# Altium footprint library Gesturelink PCB Library.PcbLib: 57 footprints (part 4 of 4)
Each footprint in its own frame and in the unit in brackets; x right, y up, seen from the top. Pads: shape width x height; smd on the part's side, far side on the other; paste and mask are expansions set on the pad; w line width, h text height; cw(c..) or ccw(c..) is an arc to the next point about the centre after c.
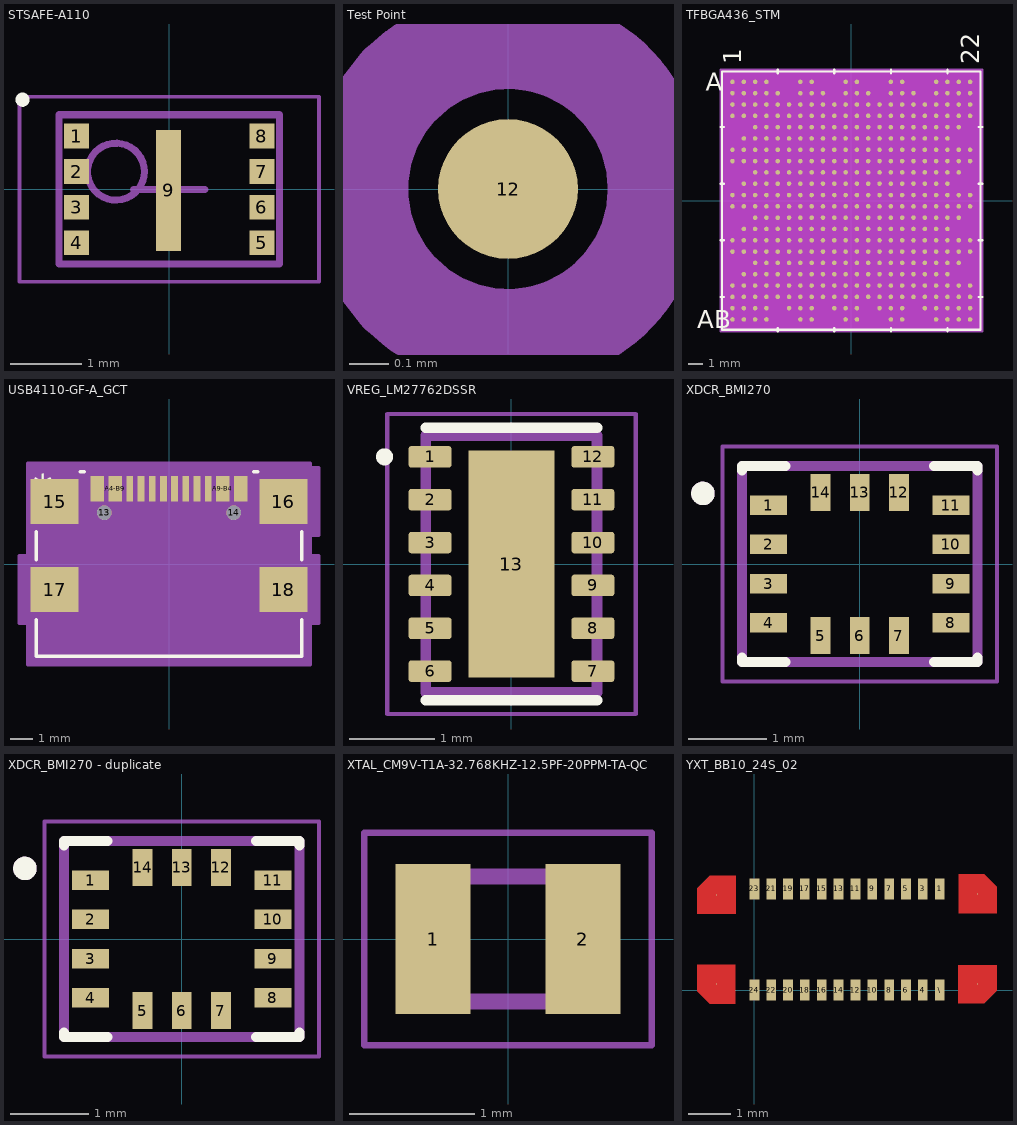
[diagram p3: the footprints below, top view; thin cyan lines are the x and y axes]

## STSAFE-A110 [mm] "SON, 8-Leads, Body 2.00x3.00mm, Pitch 0.50mm, Thermal Pad 0.00x0.00mm, IPC Medium Density"
height 0.6
pads (9):
  rect 0.35x0.35 smd: 1(-1.303,0.75) 2(-1.303,0.25) 3(-1.303,-0.25) 4(-1.303,-0.75) 5(1.303,-0.75) 6(1.303,-0.25) 7(1.303,0.25) 8(1.303,0.75)
  rect 0.35x1.7 smd: 9(-0.008,-0.012)
Top Overlay:
  circle w0.1: c-2.062,1.262 r0.05
Mechanical 13:
  circle w0.1: c-0.75,0.25 r0.4
  lines w0.1: -1.55,-1.05 -1.55,1.05 1.55,1.05 1.55,-1.05 -1.55,-1.05
Mechanical 15:
  lines w0.05: -2.105,-1.3 -2.105,1.3 2.105,1.3 2.105,-1.3 -2.105,-1.3
  lines w0.1: -0.5,0 0.5,0 ; 0,-0.5 0,0.5
3D body: height 0.6, standoff 0.02, extent -1.55,-1.05 1.55,1.05

## Test Point [mil]
pads (1):
  round 14 smd: 12(0,0)
Mechanical 15:
  circle w10: c0,0 r15

## TFBGA436_STM [mm]
pads (436):
  round 0.32 smd paste+0 mask+0: A1(-8.4,8.4) A2(-7.6,8.4) A3(-6.8,8.4) A4(-6,8.4) A7(-3.6,8.4) A8(-2.8,8.4) A11(-0.4,8.4) A12(0.4,8.4) A15(2.8,8.4) A16(3.6,8.4) A19(6,8.4) A20(6.8,8.4) A21(7.6,8.4) A22(8.4,8.4) AA1(-8.4,-7.6) AA2(-7.6,-7.6) AA3(-6.8,-7.6) AA4(-6,-7.6) AA6(-4.4,-7.6) AA7(-3.6,-7.6) AA8(-2.8,-7.6) AA10(-1.2,-7.6) AA11(-0.4,-7.6) AA12(0.4,-7.6) AA14(2,-7.6) AA15(2.8,-7.6) AA16(3.6,-7.6) AA18(5.2,-7.6) AA19(6,-7.6) AA20(6.8,-7.6) AA21(7.6,-7.6) AA22(8.4,-7.6) AB1(-8.4,-8.4) AB2(-7.6,-8.4) AB3(-6.8,-8.4) AB4(-6,-8.4) AB7(-3.6,-8.4) AB8(-2.8,-8.4) AB11(-0.4,-8.4) AB12(0.4,-8.4) AB15(2.8,-8.4) AB16(3.6,-8.4) AB19(6,-8.4) AB20(6.8,-8.4) AB21(7.6,-8.4) AB22(8.4,-8.4) B1(-8.4,7.6) B2(-7.6,7.6) B3(-6.8,7.6) B4(-6,7.6) B5(-5.2,7.6) B7(-3.6,7.6) B8(-2.8,7.6) B9(-2,7.6) B11(-0.4,7.6) B12(0.4,7.6) B13(1.2,7.6) B15(2.8,7.6) B16(3.6,7.6) B17(4.4,7.6) B19(6,7.6) B20(6.8,7.6) B21(7.6,7.6) B22(8.4,7.6) C1(-8.4,6.8) C2(-7.6,6.8) C3(-6.8,6.8) C4(-6,6.8) C5(-5.2,6.8) C6(-4.4,6.8) C7(-3.6,6.8) C8(-2.8,6.8) C9(-2,6.8) C10(-1.2,6.8) C11(-0.4,6.8) C12(0.4,6.8) C13(1.2,6.8) C14(2,6.8) C15(2.8,6.8) C16(3.6,6.8) C17(4.4,6.8) C18(5.2,6.8) C19(6,6.8) C20(6.8,6.8) C21(7.6,6.8) C22(8.4,6.8) D1(-8.4,6) D2(-7.6,6) D3(-6.8,6) D4(-6,6) D5(-5.2,6) D6(-4.4,6) D7(-3.6,6) D8(-2.8,6) D9(-2,6) D10(-1.2,6) D11(-0.4,6) D12(0.4,6) D13(1.2,6) D14(2,6) D15(2.8,6) D16(3.6,6) D17(4.4,6) D18(5.2,6) D19(6,6) D20(6.8,6) D21(7.6,6) D22(8.4,6) E3(-6.8,5.2) E4(-6,5.2) E5(-5.2,5.2) E6(-4.4,5.2) E7(-3.6,5.2) E8(-2.8,5.2) E9(-2,5.2) E10(-1.2,5.2) E11(-0.4,5.2) E12(0.4,5.2) E13(1.2,5.2) E14(2,5.2) E15(2.8,5.2) E16(3.6,5.2) E17(4.4,5.2) E18(5.2,5.2) E19(6,5.2) E20(6.8,5.2) E21(7.6,5.2) F2(-7.6,4.4) F3(-6.8,4.4) F4(-6,4.4) F5(-5.2,4.4) F6(-4.4,4.4) F7(-3.6,4.4) F8(-2.8,4.4) F9(-2,4.4) F10(-1.2,4.4) F11(-0.4,4.4) F12(0.4,4.4) F13(1.2,4.4) F14(2,4.4) F15(2.8,4.4) F16(3.6,4.4) F17(4.4,4.4) F18(5.2,4.4) F19(6,4.4) F20(6.8,4.4) G1(-8.4,3.6) G2(-7.6,3.6) G3(-6.8,3.6) G4(-6,3.6) G5(-5.2,3.6) G6(-4.4,3.6) G7(-3.6,3.6) G8(-2.8,3.6) G9(-2,3.6) G10(-1.2,3.6) G11(-0.4,3.6) G12(0.4,3.6) G13(1.2,3.6) G14(2,3.6) G15(2.8,3.6) G16(3.6,3.6) G17(4.4,3.6) G18(5.2,3.6) G19(6,3.6) G20(6.8,3.6) G21(7.6,3.6) G22(8.4,3.6) H1(-8.4,2.8) H2(-7.6,2.8) H3(-6.8,2.8) H4(-6,2.8) H5(-5.2,2.8) H6(-4.4,2.8) H7(-3.6,2.8) H8(-2.8,2.8) H9(-2,2.8) H10(-1.2,2.8) H11(-0.4,2.8) H12(0.4,2.8) H13(1.2,2.8) H14(2,2.8) H15(2.8,2.8) H16(3.6,2.8) H17(4.4,2.8) H18(5.2,2.8) H19(6,2.8) H20(6.8,2.8) H21(7.6,2.8) H22(8.4,2.8) J3(-6.8,2) J4(-6,2) J5(-5.2,2) J6(-4.4,2) J7(-3.6,2) J8(-2.8,2) J9(-2,2) J10(-1.2,2) J11(-0.4,2) J12(0.4,2) J13(1.2,2) J14(2,2) J15(2.8,2) J16(3.6,2) J17(4.4,2) J18(5.2,2) J19(6,2) J20(6.8,2) J21(7.6,2) K2(-7.6,1.2) K3(-6.8,1.2) K4(-6,1.2) K5(-5.2,1.2) K6(-4.4,1.2) K7(-3.6,1.2) K8(-2.8,1.2) K9(-2,1.2) K10(-1.2,1.2) K11(-0.4,1.2) K12(0.4,1.2) K13(1.2,1.2) K14(2,1.2) K15(2.8,1.2) K16(3.6,1.2) K17(4.4,1.2) K18(5.2,1.2) K19(6,1.2) K20(6.8,1.2) L1(-8.4,0.4) L2(-7.6,0.4) L3(-6.8,0.4) L4(-6,0.4) L5(-5.2,0.4) L6(-4.4,0.4) L7(-3.6,0.4) L8(-2.8,0.4) L9(-2,0.4) L10(-1.2,0.4) L11(-0.4,0.4) L12(0.4,0.4) L13(1.2,0.4) L14(2,0.4) L15(2.8,0.4) L16(3.6,0.4) L17(4.4,0.4) L18(5.2,0.4) L19(6,0.4) L20(6.8,0.4) L21(7.6,0.4) L22(8.4,0.4) M1(-8.4,-0.4) M2(-7.6,-0.4) M3(-6.8,-0.4) M4(-6,-0.4) M5(-5.2,-0.4) M6(-4.4,-0.4) M7(-3.6,-0.4) M8(-2.8,-0.4) M9(-2,-0.4) M10(-1.2,-0.4) M11(-0.4,-0.4) M12(0.4,-0.4) M13(1.2,-0.4) M14(2,-0.4) M15(2.8,-0.4) M16(3.6,-0.4) M17(4.4,-0.4) M18(5.2,-0.4) M19(6,-0.4) M20(6.8,-0.4) M21(7.6,-0.4) M22(8.4,-0.4) N3(-6.8,-1.2) N4(-6,-1.2) N5(-5.2,-1.2) N6(-4.4,-1.2) N7(-3.6,-1.2) N8(-2.8,-1.2) N9(-2,-1.2) N10(-1.2,-1.2) N11(-0.4,-1.2) N12(0.4,-1.2) N13(1.2,-1.2) N14(2,-1.2) N15(2.8,-1.2) N16(3.6,-1.2) N17(4.4,-1.2) N18(5.2,-1.2) N19(6,-1.2) N20(6.8,-1.2) N21(7.6,-1.2) P2(-7.6,-2) P3(-6.8,-2) P4(-6,-2) P5(-5.2,-2) P6(-4.4,-2) P7(-3.6,-2) P8(-2.8,-2) P9(-2,-2) P10(-1.2,-2) P11(-0.4,-2) P12(0.4,-2) P13(1.2,-2) P14(2,-2) P15(2.8,-2) P16(3.6,-2) P17(4.4,-2) P18(5.2,-2) P19(6,-2) P20(6.8,-2) R1(-8.4,-2.8) R2(-7.6,-2.8) R3(-6.8,-2.8) R4(-6,-2.8) R5(-5.2,-2.8) R6(-4.4,-2.8) R7(-3.6,-2.8) R8(-2.8,-2.8) R9(-2,-2.8) R10(-1.2,-2.8) R11(-0.4,-2.8) R12(0.4,-2.8) R13(1.2,-2.8) R14(2,-2.8) R15(2.8,-2.8) R16(3.6,-2.8) R17(4.4,-2.8) R18(5.2,-2.8) R19(6,-2.8) R20(6.8,-2.8) R21(7.6,-2.8) R22(8.4,-2.8) T1(-8.4,-3.6) T2(-7.6,-3.6) T3(-6.8,-3.6) T4(-6,-3.6) T5(-5.2,-3.6) T6(-4.4,-3.6) T7(-3.6,-3.6) T8(-2.8,-3.6) T9(-2,-3.6) T10(-1.2,-3.6) T11(-0.4,-3.6) T12(0.4,-3.6) T13(1.2,-3.6) T14(2,-3.6) T15(2.8,-3.6) T16(3.6,-3.6) T17(4.4,-3.6) T18(5.2,-3.6) T19(6,-3.6) T20(6.8,-3.6) T21(7.6,-3.6) T22(8.4,-3.6) U3(-6.8,-4.4) U4(-6,-4.4) U5(-5.2,-4.4) U6(-4.4,-4.4) U7(-3.6,-4.4) U8(-2.8,-4.4) U9(-2,-4.4) U10(-1.2,-4.4) U11(-0.4,-4.4) U12(0.4,-4.4) U13(1.2,-4.4) U14(2,-4.4) U15(2.8,-4.4) U16(3.6,-4.4) U17(4.4,-4.4) U18(5.2,-4.4) U19(6,-4.4) U20(6.8,-4.4) U21(7.6,-4.4) V2(-7.6,-5.2) V3(-6.8,-5.2) V4(-6,-5.2) V5(-5.2,-5.2) V6(-4.4,-5.2) V7(-3.6,-5.2) V8(-2.8,-5.2) V9(-2,-5.2) V10(-1.2,-5.2) V11(-0.4,-5.2) V12(0.4,-5.2) V13(1.2,-5.2) V14(2,-5.2) V15(2.8,-5.2) V16(3.6,-5.2) V17(4.4,-5.2) V18(5.2,-5.2) V19(6,-5.2) V20(6.8,-5.2) W1(-8.4,-6) W2(-7.6,-6) W3(-6.8,-6) W4(-6,-6) W5(-5.2,-6) W6(-4.4,-6) W7(-3.6,-6) W8(-2.8,-6) W9(-2,-6) W10(-1.2,-6) W11(-0.4,-6) W12(0.4,-6) W13(1.2,-6) W14(2,-6) W15(2.8,-6) W16(3.6,-6) W17(4.4,-6) W18(5.2,-6) W19(6,-6) W20(6.8,-6) W21(7.6,-6) W22(8.4,-6) Y1(-8.4,-6.8) Y2(-7.6,-6.8) Y3(-6.8,-6.8) Y4(-6,-6.8) Y5(-5.2,-6.8) Y6(-4.4,-6.8) Y7(-3.6,-6.8) Y8(-2.8,-6.8) Y9(-2,-6.8) Y10(-1.2,-6.8) Y11(-0.4,-6.8) Y12(0.4,-6.8) Y13(1.2,-6.8) Y14(2,-6.8) Y15(2.8,-6.8) Y16(3.6,-6.8) Y17(4.4,-6.8) Y18(5.2,-6.8) Y19(6,-6.8) Y20(6.8,-6.8) Y21(7.6,-6.8) Y22(8.4,-6.8)
Top Overlay:
  lines w0.152: -9.258,-6.8 -9.004,-6.8 ; -9.258,-2.8 -9.004,-2.8 ; -9.258,1.2 -9.004,1.2 ; -9.258,5.2 -9.004,5.2 ; -5.2,-9.258 -5.2,-9.004 ; -5.2,9.004 -5.2,9.258 ; -1.2,-9.258 -1.2,-9.004 ; -1.2,9.004 -1.2,9.258 ; 2.8,-9.258 2.8,-9.004 ; 2.8,9.004 2.8,9.258 ; 6.8,-9.258 6.8,-9.004 ; 6.8,9.004 6.8,9.258 ; 9.004,-6.8 9.258,-6.8 ; 9.004,-2.8 9.258,-2.8 ; 9.004,1.2 9.258,1.2 ; 9.004,5.2 9.258,5.2 ; -9.131,-9.131 9.131,-9.131 9.131,9.131 -9.131,9.131 -9.131,-9.131
  text "A" at -10.274,7.765 h1.27
  text "AB" at -10.909,-9.035 h1.27
  text "1" at -7.765,9.639 h1.27
  text "22" at 9.035,9.639 h1.27
Bottom Overlay:
  text "A" at -9.639,7.765 h1.27
  text "AB" at -9.639,-9.035 h1.27
  text "1" at -9.035,9.639 h1.27
  text "22" at 7.765,9.639 h1.27
Keep-Out Layer:
  region: -9.245,-9.245 -9.245,9.245 9.245,9.245 9.245,-9.245
Mechanical 13:
  lines w0.025: -9.004,8.604 -8.604,9.004 ; -9.004,-9.004 9.004,-9.004 9.004,9.004 -9.004,9.004 -9.004,-9.004
  text "A" at -10.274,7.765 h1.27
  text "AB" at -10.909,-9.035 h1.27
  text "1" at -7.765,9.639 h1.27
  text "22" at 9.035,9.639 h1.27
Mechanical 15:
  region: 9.258,-9.258 -9.258,-9.258 -9.258,9.258 9.258,9.258
  lines w0.152: -9.258,-9.258 -9.258,9.258 9.258,9.258 9.258,-9.258 -9.258,-9.258
3D body "TFBGA436_STM.step": height 1.2, standoff 0, extent -9.004,-9.004 9.004,9.004

## USB4110-GF-A_GCT [mil]
pads (18):
  round 26 / inner round 60 / far side round 26 hole 26 unplated paste-99999 mask-13: 13(-113.78,90.07) 14(113.78,90.07)
  rect 85x79 smd paste+0 mask+0: 15(-201.18,109.76) 16(201.18,109.76) 17(-201.18,-44.97) 18(201.18,-44.97)
  rect 24x45 smd paste+0 mask+0: A1-B12(-125.98,132.39) A4-B9(-94.49,132.39) A9-B4(94.49,132.39) A12-B1(125.98,132.39)
  rect 12x45 smd paste+0 mask+0: A5(-49.21,132.39) A6(-9.84,132.39) A7(9.84,132.39) A8(49.21,132.39) B5(68.9,132.39) B6(29.53,132.39) B7(-29.53,132.39) B8(-68.9,132.39)
Top Overlay:
  lines w6: -233.5,-97.57 -233.5,-162 233.5,-162 233.5,-97.57 ; -233.5,7.63 -233.5,57.16 ; -155.65,162 -148.99,162 ; 148.99,162 155.65,162 ; 233.5,7.63 233.5,57.16
  text "*" at -238.48,107.39 h50
Mechanical 13:
  lines w1: -228.5,-157 -228.5,157 228.5,157 228.5,-157 -228.5,-157
  text "*" at -238.48,107.39 h50
Mechanical 15:
  region: -263.68,-104.47 -248.5,-104.47 -248.5,-177 248.5,-177 248.5,-104.47 263.68,-104.47 263.68,14.53 248.5,14.53 248.5,50.26 263.68,50.26 263.68,169.26 248.5,169.26 248.5,177 -248.5,177 -248.5,14.53 -263.68,14.53
  lines w6: -263.68,-104.47 -263.68,14.53 -248.5,14.53 -248.5,177 248.5,177 248.5,169.26 263.68,169.26 263.68,50.26 248.5,50.26 248.5,14.53 263.68,14.53 263.68,-104.47 248.5,-104.47 248.5,-177 -248.5,-177 -248.5,-104.47 -263.68,-104.47
3D body "USB4110GFA--3DModel-STEP-269445.STEP": height 128.35, standoff -24.61, extent -222.32,-154.06 222.56,149.09

## VREG_LM27762DSSR [mm]
pads (13):
  rrect25% 0.5x0.25 smd: 1(-0.95,1.25) 2(-0.95,0.75) 3(-0.95,0.25) 4(-0.95,-0.25) 5(-0.95,-0.75) 6(-0.95,-1.25) 7(0.95,-1.25) 8(0.95,-0.75) 9(0.95,-0.25) 10(0.95,0.25) 11(0.95,0.75) 12(0.95,1.25)
  rect 1x2.65 smd paste-2: 13(0,0)
Top Overlay:
  circle w0.1: c-1.481,1.25 r0.05
  lines w0.127: -1,-1.59 1,-1.59 ; -1,1.59 1,1.59
Top Paste:
  region: 0.475,0.1 -0.475,0.1 -0.475,1.27 0.475,1.27
  region: 0.475,-1.271 -0.475,-1.271 -0.475,-0.1 0.475,-0.1
Mechanical 13:
  lines w0.127: -1,-1.5 -1,1.5 1,1.5 1,-1.5 -1,-1.5
Mechanical 15:
  lines w0.05: -1.45,-1.75 -1.45,1.75 1.45,1.75 1.45,-1.75 -1.45,-1.75
3D body "step_temp.STEP": height 0.8, standoff 0, extent -1,-1.5 1,1.5

## XDCR_BMI270 [mm]
height 0.87
pads (14):
  rect 0.475x0.25 smd: 1(-1.162,0.75) 2(-1.162,0.25) 3(-1.162,-0.25) 4(-1.162,-0.75) 8(1.162,-0.75) 9(1.162,-0.25) 10(1.162,0.25) 11(1.162,0.75)
  rect 0.25x0.475 smd: 5(-0.5,-0.913) 6(0,-0.913) 7(0.5,-0.913) 12(0.5,0.913) 13(0,0.913) 14(-0.5,0.913)
Top Overlay:
  circle w0.15: c-2,0.9 r0.075
  lines w0.127: -1.5,-1.195 -1.5,-1.25 -0.945,-1.25 ; -1.5,1.195 -1.5,1.25 -0.945,1.25 ; 0.945,-1.25 1.5,-1.25 1.5,-1.195 ; 0.945,1.25 1.5,1.25 1.5,1.195
Mechanical 13:
  circle w0.15: c-2,0.9 r0.075
  lines w0.127: -1.5,-1.25 -1.5,1.25 1.5,1.25 1.5,-1.25 -1.5,-1.25
Mechanical 15:
  lines w0.05: -1.75,-1.5 1.75,-1.5 1.75,1.5 -1.75,1.5 -1.75,-1.5
3D body "step_temp.STEP": height 0.87, standoff 0, extent -1.5,-1.25 1.5,1.25

## XDCR_BMI270 - duplicate [mm]
height 0.87
pads (14):
  rect 0.475x0.25 smd: 1(-1.162,0.75) 2(-1.162,0.25) 3(-1.162,-0.25) 4(-1.162,-0.75) 8(1.162,-0.75) 9(1.162,-0.25) 10(1.162,0.25) 11(1.162,0.75)
  rect 0.25x0.475 smd: 5(-0.5,-0.913) 6(0,-0.913) 7(0.5,-0.913) 12(0.5,0.913) 13(0,0.913) 14(-0.5,0.913)
Top Overlay:
  circle w0.15: c-2,0.9 r0.075
  lines w0.127: -1.5,-1.195 -1.5,-1.25 -0.945,-1.25 ; -1.5,1.195 -1.5,1.25 -0.945,1.25 ; 0.945,-1.25 1.5,-1.25 1.5,-1.195 ; 0.945,1.25 1.5,1.25 1.5,1.195
Mechanical 13:
  circle w0.15: c-2,0.9 r0.075
  lines w0.127: -1.5,-1.25 -1.5,1.25 1.5,1.25 1.5,-1.25 -1.5,-1.25
Mechanical 15:
  lines w0.05: -1.75,-1.5 1.75,-1.5 1.75,1.5 -1.75,1.5 -1.75,-1.5
3D body "step_temp.STEP": height 0.87, standoff 0, extent -1.5,-1.25 1.5,1.25

## XTAL_CM9V-T1A-32.768KHZ-12.5PF-20PPM-TA-QC [mm]
height 0.5
pads (2):
  rect 0.6x1.2 smd: 1(-0.6,0) 2(0.6,0)
Mechanical 13:
  lines w0.127: -0.8,-0.5 0.8,-0.5 0.8,0.5 -0.8,0.5 -0.8,-0.5
Mechanical 15:
  lines w0.05: -1.15,-0.85 1.15,-0.85 1.15,0.85 -1.15,0.85 -1.15,-0.85
3D body "CM9V-T1A-32.768KHZ-12.5PF-20PPM-TA-QC.STEP": height 0.5, standoff 0, extent -0.825,-0.5 0.775,0.5

## YXT_BB10_24S_02 [mm] "Connector 24 pins, Body 0.4mmP, IPC Medium Density"
height 2.65
pads (28):
  rect 0.23x0.5 smd: 1(4.4,2.4) 3(4,2.4) 4(4,0) 5(3.6,2.4) 6(3.6,0) 7(3.2,2.4) 8(3.2,0) 9(2.8,2.4) 10(2.8,0) 11(2.4,2.4) 12(2.4,0) 13(2,2.4) 14(2,0) 15(1.6,2.4) 16(1.6,0) 17(1.2,2.4) 18(1.2,0) 19(0.8,2.4) 20(0.8,0) 21(0.4,2.4) 22(0.4,0) 23(0.003,2.4) 24(0.003,0) \(4.4,0)
  round 0.025 smd: 25(-0.9,0.14) 25(-0.9,2.26) 25(5.3,0.14) 25(5.3,2.286)
Top Layer:
  region: 5.75,1.826 4.85,1.826 4.85,2.746 5.453,2.746 5.75,2.449
  region: 4.84,-0.31 4.84,0.59 5.76,0.59 5.76,-0.013 5.463,-0.31
  region: -1.35,0.6 -0.45,0.6 -0.45,-0.32 -1.053,-0.32 -1.35,-0.023
  region: -0.44,2.71 -0.44,1.81 -1.36,1.81 -1.36,2.413 -1.063,2.71
3D body "YXT-BB10-24S-02--3DModel-STEP-269445.STEP": height 0.8, standoff 0, extent -1.45,-0.1 5.85,2.5